# Altium footprint library hphonglib.PcbLib: 703 footprints (part 2 of 44)
Each footprint in its own frame and in the unit in brackets; x right, y up, seen from the top. Pads: shape width x height; smd on the part's side, far side on the other; paste and mask are expansions set on the pad; w line width, h text height; cw(c..) or ccw(c..) is an arc to the next point about the centre after c.
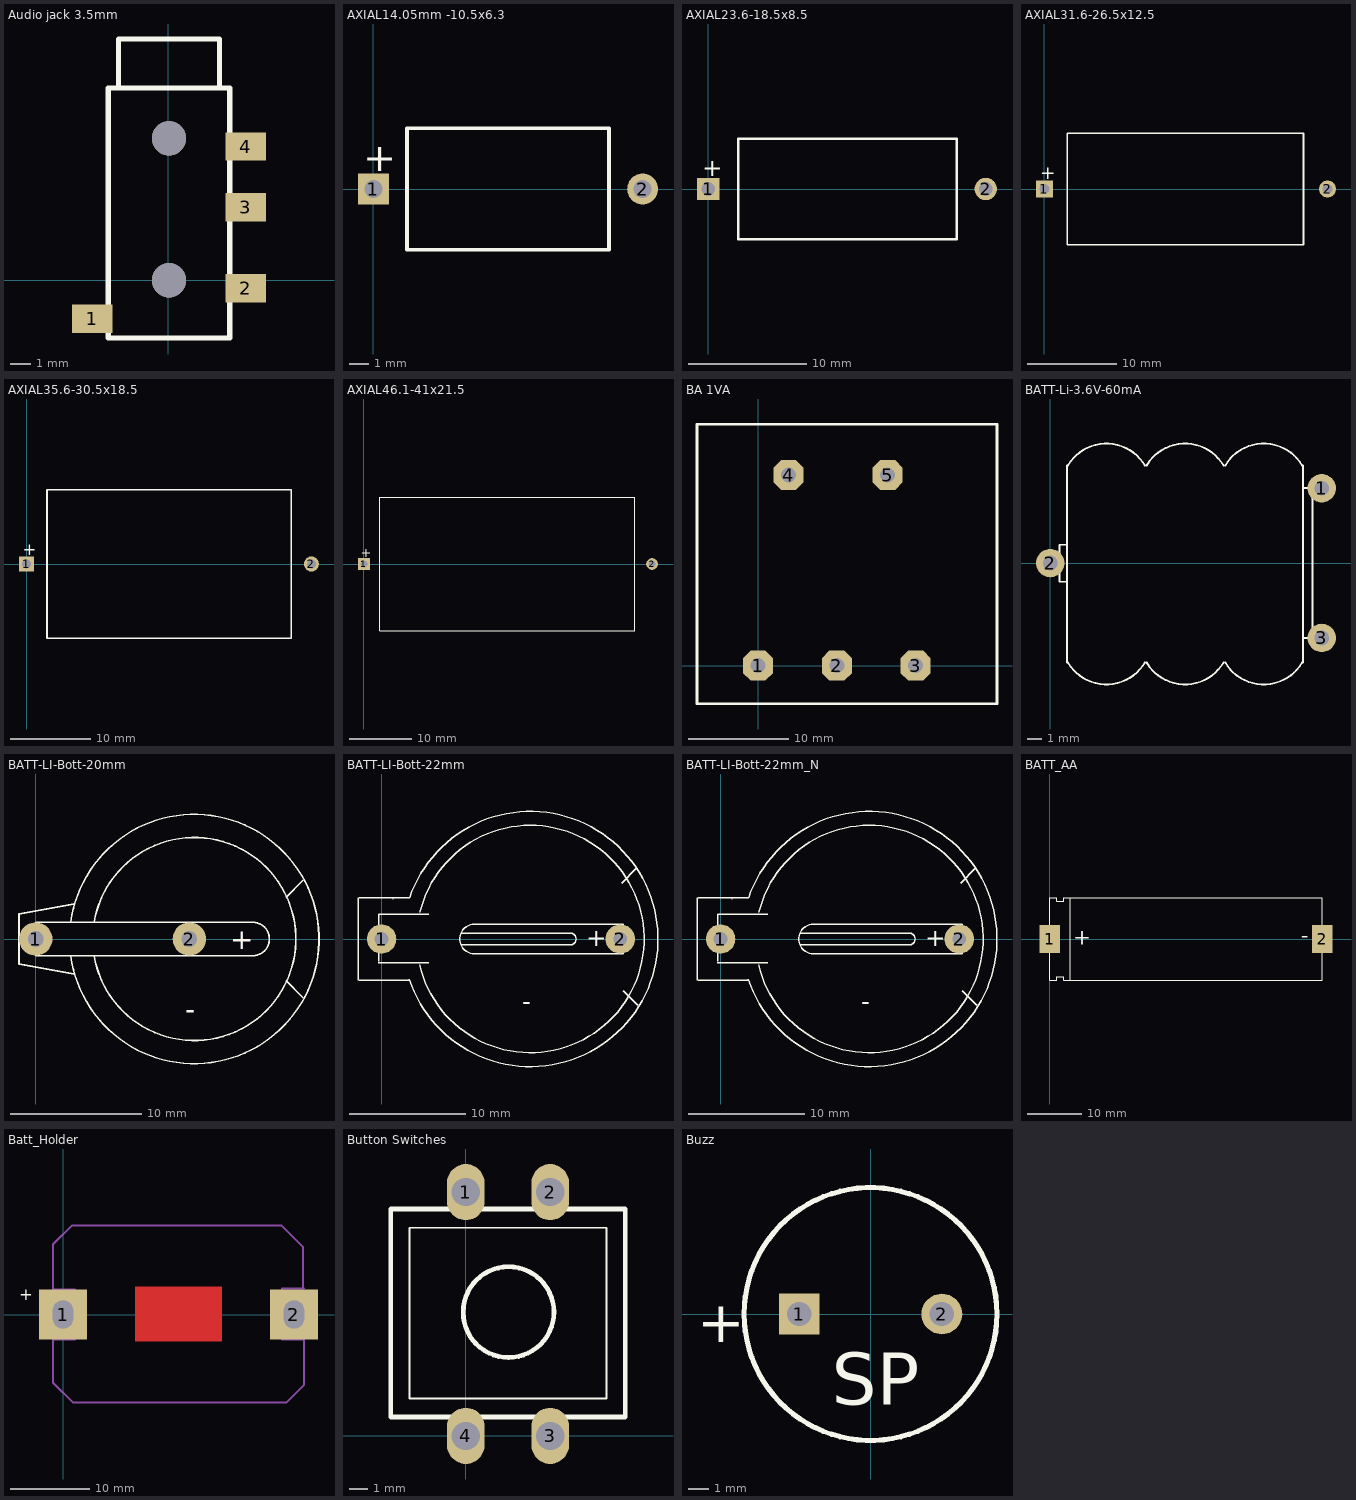
[diagram p1: the footprints below, top view; thin cyan lines are the x and y axes]

## Audio jack 3.5mm [mm]
pads (6):
  rect 2x1.4 smd: 1(-3.775,-1.897) 2(3.825,-0.397) 3(3.825,3.603) 4(3.825,6.603)
  round 1.7 hole 1.7 paste+0 mask+0: ""(0.025,0.003) ""(0.025,7.003)
Top Overlay:
  lines w0.254: -2.475,9.487 -2.475,11.913 2.525,11.913 2.525,9.487 ; -2.975,-2.845 -2.975,9.5 3.025,9.5 3.025,-2.845 -2.975,-2.845
Mechanical 13:
  text ".Designator" at 0.573,-0.828 h2.03
3D body: height 0.15, standoff 0.01, extent 2.416,6.071 4.42,7.078
3D body: height 0.15, standoff 0.01, extent 2.416,3.15 4.42,4.157
3D body: height 0.15, standoff 0.01, extent -4.37,-2.43 -2.366,-1.422
3D body: height 5, standoff 0.01, extent -3.068,-2.939 3.119,11.975
3D body: height 4.8, standoff 0.01, extent -2.737,7.603 -2.462,9.303
3D body: height 4.8, standoff 0.01, extent -2.75,-2.247 -2.475,-0.547
3D body: height 4.8, standoff 0.01, extent 2.525,4.903 2.8,6.603
3D body: height 0.15, standoff 0.01, extent 2.416,-0.914 4.42,0.093
3D body: height 0.8, standoff 0, extent -0.843,6.153 0.872,7.867
3D body: height 0.8, standoff 0, extent -0.843,-0.847 0.872,0.867

## AXIAL14.05mm -10.5x6.3 [mm] "Capacitor, Axial, Polarised; Body 10.5 x 6.3 mm (LxDia. max), Lead Dia. 0.6 mm (typ)"
height 5.08
pads (2):
  rect 1.6x1.6 hole 0.95: 1(0,0)
  round 1.6 hole 0.95: 2(13.97,0)
Top Overlay:
  lines w0.2: 1.735,-3.15 12.235,-3.15 12.235,3.15 1.735,3.15 1.735,-3.15
  text "+" at -0.54,0.925 h1.5

## AXIAL23.6-18.5x8.5 [mm] "Capacitor, Axial, Polarised; Body 18.5 x 8.5 mm (LxDia. max), Lead Dia. 0.8 mm (typ)"
height 5.08
pads (2):
  rect 1.9x1.9 hole 1.15: 1(0,0)
  round 1.9 hole 1.15: 2(23.495,0)
Top Overlay:
  lines w0.2: 2.55,-4.25 21.05,-4.25 21.05,4.25 2.55,4.25 2.55,-4.25
  text "+" at -0.5,1.075 h1.5

## AXIAL31.6-26.5x12.5 [mm] "Capacitor, Axial, Polarised; Body 26.5 x 12.5 mm (LxDia. max), Lead Dia. 0.8 mm (typ)"
height 5.08
pads (2):
  rect 1.9x1.9 hole 1.15: 1(0,0)
  round 1.9 hole 1.15: 2(31.75,0)
Top Overlay:
  lines w0.2: 2.55,-6.25 2.55,6.25 29.05,6.25 29.05,-6.25 2.55,-6.25
  text "+" at -0.5,1.075 h1.5

## AXIAL35.6-30.5x18.5 [mm] "Capacitor, Axial, Polarised; Body 30.5 x 18.5 mm (LxDia. max), Lead Dia. 0.8 mm (typ)"
height 5.08
pads (2):
  rect 1.9x1.9 hole 1.15: 1(0,0)
  round 1.9 hole 1.15: 2(35.56,0)
Top Overlay:
  lines w0.2: 2.55,-9.25 2.55,9.25 33.05,9.25 33.05,-9.25 2.55,-9.25
  text "+" at -0.5,1.075 h1.5

## AXIAL46.1-41x21.5 [mm] "Capacitor, Axial, Polarised; Body 41 x 21.5 mm (LxDia. max), Lead Dia. 0.8 mm (typ)"
height 5.08
pads (2):
  rect 1.9x1.9 hole 1.15: 1(0,0)
  round 1.9 hole 1.15: 2(46.355,0)
Top Overlay:
  lines w0.2: 2.55,-10.75 43.55,-10.75 43.55,10.75 2.55,10.75 2.55,-10.75
  text "+" at -0.5,1.075 h1.5

## BA 1VA [mm]
pads (5):
  oct 3x3 hole 1.5: 1(0,0) 2(7.874,0) 3(15.748,0) 4(3.048,19.05) 5(12.954,19.05)
Top Overlay:
  lines w0.254: -5.334,24.13 23.876,24.13 23.876,-3.81 -6.096,-3.81 -6.096,24.13 -5.08,24.13

## BATT-Li-3.3V [mm]
3D body: height 0.51, standoff -2.67, extent -9.982,-9.957 10.033,10.058

## BATT-Li-3.6V-60mA [mil]
pads (3):
  round 76 hole 39.37 unplated: 1(725,200) 2(0,0) 3(725,-200)
Top Overlay:
  lines w5: 44,-50 25,-50 25,49 44,49 ; 45,-265 45,260 ; 47.08,-265.14 ccw(c150,-205) 253.02,-264.96 ; 47.08,260.14 cw(c150,200) 253.02,259.96 ; 257.08,-265.14 ccw(c360,-205) 463.02,-264.96 ; 257.08,260.14 cw(c360,200) 463.02,259.96 ; 467.08,-265.14 ccw(c570,-205) 673.02,-264.96 ; 467.08,260.14 cw(c570,200) 673.02,259.96 ; 675,-265 675,260 ; 675,-200 700,-200 700,200 675,200
Mechanical 1:
  text "3.6 V" at 225,100 h60
  text "60mA" at 250,-25 h60
  text "+" at 597.64,-30.4 h60.8

## BATT-LI-Bott-20mm [mil]
pads (2):
  round 100 hole 47.24 unplated: 1(0,0) 2(460,0)
Top Overlay:
  lines w5: 105,-50.03 ccw(c475,0) 105,50.03 ; 115,-105 -50,-75 -50,75 115,105 ; 175.03,-50.2 ccw(c475,0) 175.03,50.2 ; 750,-125 800,-175 ; 750,125 800,175 ; 0,-50 650,-50 ccw(c650,0) 650,50 0,50 0,-50
  text "+" at 582.64,-30.4 h60.8
  text "-" at 447.64,-240.4 h60.8

## BATT-LI-Bott-22mm [mil]
pads (2):
  round 100 hole 47.24 unplated: 1(0,0) 2(810,0)
Top Overlay:
  lines w5: -80,-140 -80,140 ; -75.45,-140 95,-140 ; -75.45,140 95,140 ; -10.63,-80.04 159.83,-80.04 ; -9.78,-75 -9.78,83.62 160.68,83.62 ; 38.72,137.04 40.28,135.96 ; 94.15,-136.95 ccw(c505,0) 95.16,139.94 ; 129.15,-87.15 ccw(c505,0) 130.07,91.05 ; 270,-20 640,-20 ccw(c640,0) 640,20 270,20 ; 815,190 865,240 ; 820,-175 870,-225 ; 315,-50 cw(c315,0) 315,50 820,50 820,-50 315,-50
  text "+" at 695,-25 h60.8
  text "-" at 477.64,-240.4 h60.8
3D body: height 275.59, standoff 3.94, extent 93.5,-433.07 507.87,-79.72
3D body: height 275.59, standoff 7.87, extent 90.55,82.68 510.83,433.07
3D body: height 275.59, standoff 7.87, extent 507.87,-435.45 938.4,431.51
3D body: height 59.06, standoff 39.37, extent 264.34,-51.61 812.01,49.63
3D body: height 59.06, standoff 39.37, extent 4.43,-69.96 122.13,-28.06
3D body: height 59.06, standoff 39.37, extent 3.94,31.17 121.64,73.08
3D body: height 283.46, standoff 39.37, extent 120.08,-71.24 148.99,72.83
3D body: height 283.46, standoff 39.37, extent -19.68,-88.66 8.94,93.5
3D body: height 39.37, standoff 3.94, extent 119.59,-396.15 897.14,389.27
3D body: height 275.59, standoff 3.94, extent -80.71,-143.7 104.66,140.75

## BATT-LI-Bott-22mm_N [mil]
pads (2):
  round 100 hole 47.24 unplated: 1(0,0) 2(810,0)
Top Overlay:
  lines w5: -80,-140 -80,140 ; -75.45,-140 95,-140 ; -75.45,140 95,140 ; -10.63,-80.04 159.83,-80.04 ; -9.78,-75 -9.78,83.62 160.68,83.62 ; 38.72,137.04 40.28,135.96 ; 94.15,-136.95 ccw(c505,0) 95.16,139.94 ; 129.15,-87.15 ccw(c505,0) 130.07,91.05 ; 270,-20 640,-20 ccw(c640,0) 640,20 270,20 ; 815,190 865,240 ; 820,-175 870,-225 ; 315,-50 cw(c315,0) 315,50 820,50 820,-50 315,-50
  text "-" at 477.64,-240.4 h60.8
  text "+" at 695,-25 h60.8
3D body: height 212, standoff -293, extent -27,-377 870,373

## BATT_AA [mm]
pads (2):
  rect 3.81x5.08 smd: 1(0,0) 2(50.165,0)
Top Overlay:
  lines w0.127: 3.81,-7.62 3.81,7.62 ; 0,-7.62 0,7.62 1.27,7.62 1.27,6.985 2.54,6.985 2.54,7.62 50.165,7.62 50.165,-7.62 2.54,-7.62 2.54,-6.985 1.27,-6.985 1.27,-7.62 0,-7.62
  text "+" at 7.653,1.448 h2.9
  text "-" at 47.658,1.448 h2.9
Mechanical 1:
  text "AA" at 22.86,-1.27 h2.9

## Batt_Holder [mil] "Battery Holders"
pads (2):
  rect 240x250 hole 102 slot 140 at 90 deg: 1(0,0) 2(1154,0)
Top Layer:
  rectangle: 360,-135 795,140
Top Overlay:
  text "+" at -220,70 h60
Mechanical 5:
  lines w10: 1205,130 1200,130 ; 1200,130 1200,335 1090,445 45,445 -50,350 -50,125 60,125 60,-125 -50,-125 -50,-340 50,-440 1115,-440 1205,-350 1205,-125 1095,-125 1095,130 1200,130
3D body: height 264, standoff 0, extent -50.02,-440.02 1205.02,445.02
3D body: height 400, standoff -100, extent -20,-70 25,70
3D body: height 100, standoff 0, extent 1095,-125.24 1205,130
3D body: height 100, standoff 0, extent -50,-125 60,125
3D body: height 400, standoff -100, extent 1130,-70 1180,70

## Button Switches [mm]
pads (4):
  oval 2x3 hole 1.5: 1(0,13) 2(4.5,13) 3(4.5,0) 4(0,0)
Top Overlay:
  circle w0.254: c2.279,6.6 r2.421
  lines w0.1: -3,2 7.5,2 7.5,11.1 -3,11.1 -3,2
  lines w0.254: -4,1 -4,12.1 8.5,12.1 8.5,1 -4,1

## Buzz [mm] "Speaker footprint"
pads (2):
  rect 2x2 hole 1.2: 1(-3.5,0)
  round 2 hole 1.2: 2(3.5,0)
Top Overlay:
  circle w0.254: c0,0 r6.2
  text "+" at -8.509,-1.397 h2.03
  text "SP" at -1.905,-4.445 h2.54
Bottom Overlay:
  circle w0.254: c-0.025,0 r6.228
3D body: height 9.65, standoff -4.5, extent -9.511,-6.051 5.944,5.949